# Altium footprint library USB Port.PcbLib: 17 footprints (part 1 of 2)
Each footprint in its own frame and in the unit in brackets; x right, y up, seen from the top. Pads: shape width x height; smd on the part's side, far side on the other; paste and mask are expansions set on the pad; w line width, h text height; cw(c..) or ccw(c..) is an arc to the next point about the centre after c.
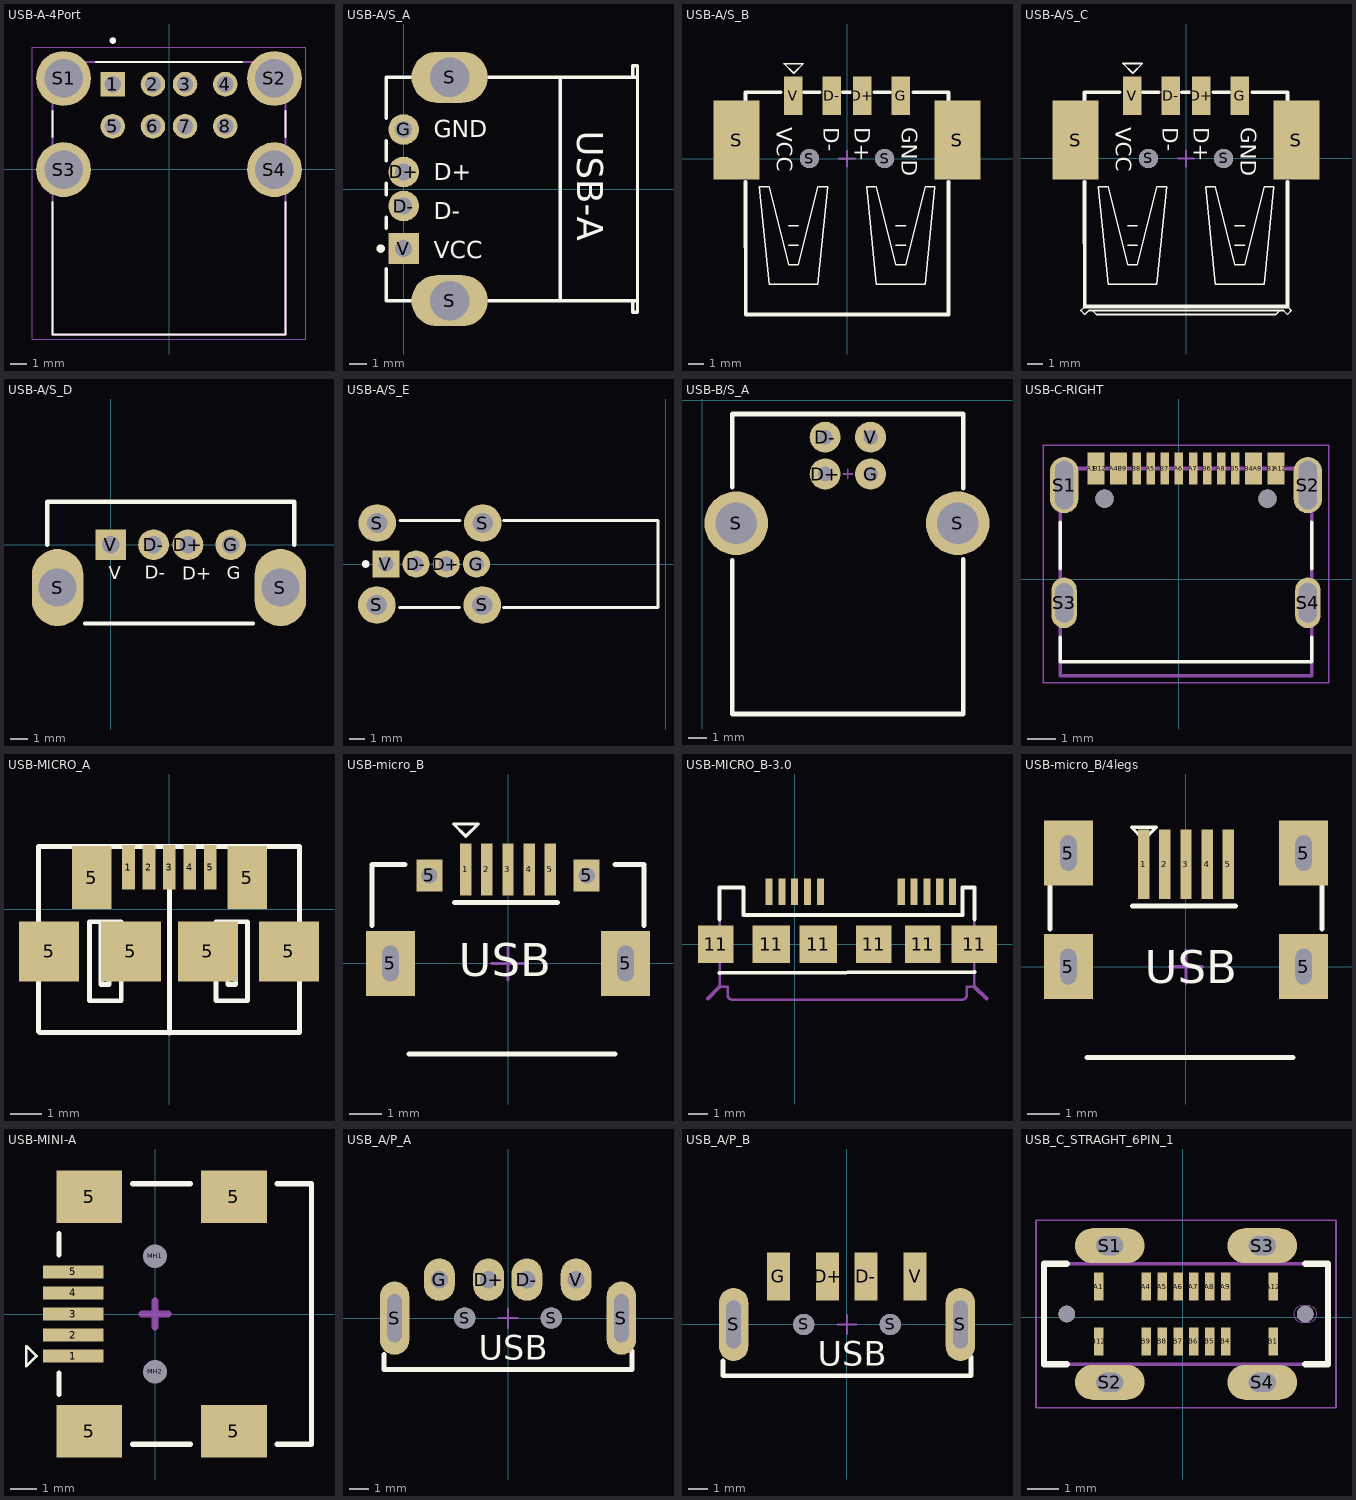
[diagram p0: the footprints below, top view; thin cyan lines are the x and y axes]

## USB-A-4Port [mm]
pads (12):
  rect 1.53x1.53 / inner round 1.53 / far side rect 1.53x1.53 hole 1.02: 1(-3.5,5.305)
  round 1.53 hole 1.02: 2(-1,5.305) 3(1,5.305) 4(3.5,5.305) 5(-3.5,2.685) 6(-1,2.685) 7(1,2.685) 8(3.5,2.685)
  round 3.416 hole 2.4: S1(-6.57,5.655) S2(6.57,5.655) S3(-6.57,-0.025) S4(6.57,-0.025)
Top Overlay:
  circle w0.2: c-3.5,8.015 r0.1
  lines w0.127: -7.25,-2.055 -7.25,-10.305 7.25,-10.305 7.25,-2.055 ; -7.25,2.005 -7.25,3.625 ; -4.54,6.675 4.54,6.675 ; 7.25,2.005 7.25,3.625
Mechanical 13:
  circle w0.2: c-3.5,8.015 r0.1
  lines w0.127: -7.25,-10.325 7.25,-10.325 7.25,6.675 -7.25,6.675 -7.25,-10.305 -7.25,-10.325
Mechanical 15:
  lines w0.05: -8.53,-10.575 -8.53,7.615 8.53,7.615 8.53,-10.575 -8.53,-10.575
3D body "step_temp.STEP": height 15.95, standoff -4.24, extent -7.9,-10.325 7.9,6.875

## USB-A/S_A [mm] "Aï¿½ï¿½Ö±ï¿½ï¿½Ä¸Í·ï¿½ï¿½"
height 7.01
pads (6):
  round 1.8 hole 1: D+(0,1) D-(0,-1) G(0,3.5)
  oval 4.5x3 hole 2.3: S(2.71,-6.57) S(2.71,6.57)
  rect 1.8x1.8 hole 1: V(0,-3.5)
Top Overlay:
  circle w0.25: c-1.35,-3.5 r0.125
  lines w0.2: -1.01,-4.7 -1.01,-6.565 0.41,-6.565 ; -1.01,-2.3 -1.01,-1.66 ; -1.01,-0.34 -1.01,0.34 ; -1.01,1.66 -1.01,2.84 ; -1.01,4.16 -1.01,6.565 0.41,6.565 ; 5.01,-6.565 13.752,-6.565 ; 5.01,6.565 13.752,6.565 ; 13.462,-6.565 13.462,-7.25 13.752,-7.25 13.752,7.25 13.462,7.25 13.462,6.565
  lines w0.203: 9.21,-6.565 9.21,6.565
  text "GND" at 1.778,3.048 h1.02
  text "D+" at 1.778,0.508 h1.02
  text "D-" at 1.778,-1.778 h1.02
  text "VCC" at 1.778,-4.064 h1.02
  text "USB-A" at 10.21,3.43 h1.52
3D body "USB A�� ĸ-1.STEP": height 6.8, standoff -4.31, extent -0.605,-7.342 13.7,7.342

## USB-A/S_B [mm] "Aï¿½ï¿½ï¿½ï¿½Æ¬Ä¸Í·ï¿½ï¿½"
pads (8):
  rect 1.2x2.5 smd: D+(1,4.1) D-(-1,4.1) G(3.5,4.1) V(-3.5,4.1)
  rect 3x5.15 smd: S(-7.2,1.2) S(7.2,1.2)
  round 1.25 hole 1.25 unplated: S(-2.45,0) S(2.45,0)
Top Overlay:
  lines w0.1: -3.803,-5.649 -3.168,-5.649 ; -3.803,-4.379 -3.168,-4.379 ; 3.182,-5.649 3.817,-5.649 ; 3.182,-4.379 3.817,-4.379 ; -5.708,-1.839 -5.073,-8.189 -1.898,-8.189 -1.263,-1.839 -1.898,-1.839 -3.168,-6.919 -3.803,-6.919 -5.073,-1.839 -5.708,-1.839 ; -4.113,6.19 -3.478,5.555 -2.843,6.19 -4.113,6.19 ; 1.277,-1.839 1.912,-8.189 5.087,-8.189 5.722,-1.839 5.087,-1.839 3.817,-6.919 3.182,-6.919 1.912,-1.839 1.277,-1.839
  lines w0.254: -6.604,-1.524 -6.597,-10.16 6.611,-10.16 6.604,-1.524 ; -6.604,3.81 -6.604,4.318 -4.318,4.318 ; -2.794,4.318 -1.778,4.318 ; -0.254,4.318 0.254,4.318 ; 1.778,4.318 2.794,4.318 ; 4.318,4.318 6.611,4.318 6.604,3.81
  text "GND" at 3.556,2.032 h1.02
  text "D+" at 0.508,2.032 h1.02
  text "D-" at -1.524,2.032 h1.02
  text "VCC" at -4.572,2.032 h1.02
Mechanical 15:
  lines w0.127: -0.508,0 0.508,0 ; 0,-0.508 0,0.508
3D body "USB A�� ��Ƭ-ĸ-1.STEP": height 6.9, standoff -0.55, extent -7.75,-9.9 7.75,4.8

## USB-A/S_C [mm] "Aï¿½ï¿½ï¿½ï¿½Æ¬Ä¸Í·ï¿½ï¿½"
pads (8):
  rect 1.2x2.5 smd: D+(1,4.1) D-(-1,4.1) G(3.5,4.1) V(-3.5,4.1)
  rect 3x5.15 smd: S(-7.2,1.2) S(7.2,1.2)
  round 1.25 hole 1.25 unplated: S(-2.45,0) S(2.45,0)
Top Overlay:
  lines w0.1: -6.597,-9.652 -6.851,-9.906 -6.597,-10.16 -6.343,-9.906 -6.089,-9.906 ; -3.803,-5.649 -3.168,-5.649 ; -3.803,-4.379 -3.168,-4.379 ; 3.182,-5.649 3.817,-5.649 ; 3.182,-4.379 3.817,-4.379 ; 6.611,-9.652 6.865,-9.906 6.611,-10.16 6.357,-9.906 6.103,-9.906 ; -6.089,-9.906 -5.835,-10.166 5.849,-10.166 6.103,-9.906 ; -6.089,-9.906 6.103,-9.906 ; -5.708,-1.839 -5.073,-8.189 -1.898,-8.189 -1.263,-1.839 -1.898,-1.839 -3.168,-6.919 -3.803,-6.919 -5.073,-1.839 -5.708,-1.839 ; -4.113,6.19 -3.478,5.555 -2.843,6.19 -4.113,6.19 ; 1.277,-1.839 1.912,-8.189 5.087,-8.189 5.722,-1.839 5.087,-1.839 3.817,-6.919 3.182,-6.919 1.912,-1.839 1.277,-1.839
  lines w0.254: -6.604,-1.524 -6.597,-9.652 ; -6.604,3.81 -6.604,4.318 -4.318,4.318 ; -6.597,-9.652 6.611,-9.652 ; -2.794,4.318 -1.778,4.318 ; -0.254,4.318 0.254,4.318 ; 1.778,4.318 2.794,4.318 ; 4.318,4.318 6.611,4.318 6.604,3.81 ; 6.604,-1.524 6.611,-9.652
  text "GND" at 3.556,2.032 h1.02
  text "D+" at 0.508,2.032 h1.02
  text "D-" at -1.524,2.032 h1.02
  text "VCC" at -4.572,2.032 h1.02
Mechanical 15:
  lines w0.127: -0.508,0 0.508,0 ; 0,-0.508 0,0.508
3D body "USB A�� ��Ƭ-ĸ-2.STEP": height 7.4, standoff -0.55, extent -7.75,-9.9 7.75,4.8

## USB-A/S_D [mm] "Aï¿½ï¿½Ö±ï¿½ï¿½Ä¸Í·ï¿½ï¿½"
pads (6):
  round 1.8 hole 1: D+(4.5,0) D-(2.5,0) G(7,0)
  oval 3x4.5 hole 2.2: S(-3.1,-2.5) S(9.9,-2.5)
  rect 1.8x1.8 hole 1: V(0,0)
Top Overlay:
  lines w0.254: -3.7,0 -3.7,2.5 10.7,2.5 10.7,0 ; -1.5,-4.6 8.3,-4.6
  text "V" at -0.112,-2.007 h0.76
  text "G" at 6.771,-2.007 h0.76
  text "D+" at 4.181,-2.032 h0.76
  text "D-" at 1.996,-1.981 h0.76
Mechanical 1:
  lines w0.254: -0.2,-0.2 cw(c0,-0.2) 0,0
3D body "USB-H.stp": height 14, standoff -4, extent -3.705,-4.599 10.695,2.501

## USB-A/S_E [mm] "Aï¿½ï¿½Ö±ï¿½ï¿½Ä¸Í·ï¿½ï¿½"
pads (8):
  round 1.8 hole 1: D+(-14.56,0) D-(-16.56,0) G(-12.56,0)
  round 2.5 hole 1.35: S(-19.167,-2.718) S(-19.141,2.718) S(-12.167,-2.718) S(-12.141,2.718)
  rect 1.8x1.8 hole 1: V(-18.56,0)
Top Overlay:
  circle w0.25: c-19.91,0 r0.125
  lines w0.2: -17.65,-2.878 -13.684,-2.878 ; -17.624,2.878 -13.658,2.878 ; -10.773,-2.88 -0.508,-2.88 -0.508,2.88 -10.773,2.88
3D body "USB-4H4.stp": height 14.45, standoff -3.69, extent -19.725,-3.606 -0.475,3.644

## USB-B/S_A [mm] "bï¿½ï¿½USB Ä¸ï¿½ï¿½ 16.3*13.7*11mm"
height 1.1
pads (6):
  round 1.7 hole 0.8: D+(6.751,-4.064) D-(6.751,-2.032) G(9.251,-4.064) V(9.251,-2.032)
  round 3.5 hole 2.3: S(1.86,-6.774) S(14.052,-6.774)
Top Overlay:
  lines w0.254: 1.651,-8.801 1.651,-17.272 14.351,-17.272 14.351,-8.75 ; 1.651,-4.788 1.651,-0.762 14.351,-0.762 14.351,-4.839
Mechanical 15:
  lines w0.1: 7.747,-4.064 8.255,-4.064 ; 8.001,-4.318 8.001,-3.81
3D body "USB B�� ĸ-1.STEP": height 11.45, standoff -2.95, extent 1.141,-17.224 14.86,-0.924

## USB-C-RIGHT [mm]
pads (22):
  rect 0.3x1.14 smd: A1(-3.096,3.937) A4(-2.296,3.937) A5(-0.996,3.937) A6(0.004,3.937) A7(0.504,3.937) A8(1.504,3.937) A9(2.804,3.937) A12(3.604,3.937) B1(3.304,3.937) B4(2.504,3.937) B5(2.004,3.937) B6(1.004,3.937) B7(-0.496,3.937) B8(-1.496,3.937) B9(-1.996,3.937) B12(-2.796,3.937)
  oval 1x2 hole 0.65 slot 1.72 at 90 deg: S1(-4.071,3.347) S2(4.579,3.347)
  oval 0.9x1.8 hole 0.65 slot 1.4 at 90 deg: S3(-4.071,-0.833) S4(4.579,-0.833)
  round 0.65 hole 0.65 unplated: ""(-2.636,2.867) ""(3.144,2.867)
Top Overlay:
  lines w0.127: -4.216,-2.063 -4.216,-2.923 4.724,-2.923 4.724,-2.063 ; -4.216,0.387 -4.216,2.027 ; 4.724,0.387 4.724,2.027
Mechanical 1:
  lines w0: 4.254,3.844 cw(c4.589,3.862) 4.571,4.197 cw(c4.589,3.882) 4.904,3.899 ; 4.254,3.847 4.254,2.797 ccw(c4.564,2.807) 4.575,2.497 ; 4.572,2.497 ccw(c4.589,2.812) 4.904,2.795 ; 4.904,2.797 4.904,3.897
Mechanical 13:
  lines w0.127: -4.216,-3.413 4.724,-3.413 4.724,3.937 -4.216,3.937 -4.216,-3.413
Mechanical 15:
  lines w0.05: -4.821,-3.663 5.329,-3.663 5.329,4.757 -4.821,4.757 -4.821,-3.663
3D body "step_temp.STEP": height 3.26, standoff -1, extent -4.216,-3.359 4.724,4.391

## USB-MICRO_A [mm] "microï¿½ï¿½USB ï¿½ï¿½5.9*8.2*2.5mm"
pads (11):
  rect 0.4x1.4 smd: 1(-1.283,1.333) 2(-0.635,1.333) 3(0.013,1.333) 4(0.66,1.333) 5(1.308,1.333)
  rect 1.9x1.9 smd: 5(-3.797,-1.333) 5(-1.206,-1.333) 5(1.232,-1.333) 5(3.797,-1.333)
  rect 1.25x2 smd: 5(-2.451,1.003) 5(2.476,1.003)
Top Overlay:
  lines w0.152: -4.127,-3.873 -4.127,1.994 ; -4.102,-3.899 4.102,-3.899 ; -4.077,1.994 4.102,1.994 ; -2.152,-0.394 -2.152,-2.379 -1.949,-2.379 -1.898,-2.379 -1.898,-0.394 ; 0.013,-3.91 0.013,1.968 ; 1.861,-0.394 1.861,-2.379 2.115,-2.379 2.115,-0.394 ; 4.127,-3.899 4.127,1.994 ; -2.513,-2.894 -1.513,-2.894 -1.513,-0.394 -2.513,-0.394 -2.513,-2.894 ; 1.487,-2.894 1.487,-0.394 2.487,-0.394 2.487,-2.894 1.487,-2.894
3D body "MICRO USB.STEP": height 2.77, standoff -0.17, extent -4.1,-3.912 4.1,2.018

## USB-micro_B [mm] "microï¿½ï¿½USB ï¿½ï¿½5.7*7.8*2.5mm"
pads (9):
  rect 0.35x1.6 smd: 1(-1.3,2.9) 2(-0.65,2.9) 3(0,2.9) 4(0.65,2.9) 5(1.3,2.9)
  rect 1.5x2 hole 0.5 slot 1.1 at 90 deg: 5(-3.625,0) 5(3.625,0)
  rect 0.8x1 hole 0.5: 5(-2.425,2.71) 5(2.425,2.71)
Top Overlay:
  lines w0.1: -1.681,4.297 -0.919,4.297 -1.3,3.916 -1.681,4.297
  lines w0.152: -4.191,1.168 -4.191,3.048 -3.175,3.048 ; -3.048,-2.794 3.302,-2.794 ; -1.65,1.875 1.525,1.875 ; 3.302,3.048 4.191,3.048 4.191,1.168
  text "USB" at -1.524,-0.402 h1.02
Mechanical 15:
  lines w0.1: -0.508,0 0.508,0 ; 0,-0.508 0,0.508
3D body "USB micro_A.STEP": height 2.8, standoff -0.95, extent -4.001,-2.71 4.001,2.89

## USB-MICRO_B-3.0 [mm]
pads (16):
  rect 0.36x1.35 smd: 1(-1.3,2.667) 2(-0.65,2.667) 3(0,2.667) 4(0.65,2.667) 5(1.3,2.667) 6(5.4,2.667) 7(6.05,2.667) 8(6.7,2.667) 9(7.35,2.667) 10(8,2.667)
  rect 1.8x1.9 smd: 11(-4,0) 11(4,0) 11(6.5,0)
  rect 1.9x1.9 smd: 11(-1.2,0) 11(1.2,0)
  rect 2.3x1.9 smd: 11(9.1,0)
Top Overlay:
  lines w0.203: -3.8,-1.45 9.1,-1.4 ; -3.8,1.27 -3.8,2.87 -2.6,2.87 -2.6,1.473 8.5,1.473 8.5,2.87 9.104,2.87 9.104,1.27
Mechanical 16:
  lines w0.127: 1.81,1.473 -2.6,1.473 -2.6,2.87 -3.8,2.87 -3.8,-1.45 ; 3.004,-1.45 -3.8,-1.45 ; 8.469,-2.8 ccw(c8.486,-2.56) 8.723,-2.6 8.723,-2.15 9.104,-2.15 9.104,-1.45 9.104,2.87 8.5,2.87 8.5,1.473 ; 8.5,-2.8 -3.2,-2.8 cw(c-3.162,-2.565) -3.4,-2.55 -3.4,-2.15 -3.8,-2.15 -3.8,-1.45
  lines w0.203: -4.4,-2.75 -3.8,-2.15 ; 9.104,-2.15 9.713,-2.75
3D body "uj3-miabh-1-smt.stp": height 2.75, standoff -0.27, extent -4.425,-2.809 9.725,2.9

## USB-micro_B/4legs [mm] "microï¿½ï¿½USB ï¿½ï¿½5.7*7.8*2.5mm"
pads (9):
  rect 0.35x2.15 smd: 1(-1.3,3.154) 2(-0.65,3.154) 3(0,3.154) 4(0.65,3.154) 5(1.3,3.154)
  rect 1.5x2 hole 0.5 slot 1.1 at 90 deg: 5(-3.625,0) 5(-3.625,3.5) 5(3.625,0) 5(3.625,3.5)
Top Overlay:
  lines w0.1: -1.681,4.297 -1.3,3.916 -0.919,4.297 -1.681,4.297
  lines w0.152: -4.191,1.168 -4.191,3.048 -3.175,3.048 ; -3.048,-2.794 3.302,-2.794 ; -1.65,1.875 1.525,1.875 ; 3.302,3.048 4.191,3.048 4.191,1.168
  text "USB" at -1.27,-0.508 h1.02
Mechanical 15:
  lines w0.1: -0.508,0 0.508,0 ; 0,-0.508 0,0.508
3D body "micre USB.stp": height 2.7, standoff -0.67, extent -4,-2.718 4,3.882

## USB-MINI-A [mm] "MINIï¿½ï¿½USBï¿½ï¿½7.9*7.5*4.1mm"
pads (11):
  rect 2.3x0.5 smd: 1(-3.108,-1.6) 2(-3.108,-0.8) 3(-3.108,0) 4(-3.108,0.8) 5(-3.108,1.6)
  rect 2.5x2 smd: 5(-2.5,-4.45) 5(-2.5,4.45) 5(3,-4.45) 5(3,4.45)
  round 0.6 hole 0.9 unplated: MH1(0,2.2) MH2(0,-2.2)
Top Overlay:
  lines w0.1: -4.886,-1.981 -4.886,-1.219 -4.505,-1.6 -4.886,-1.981
  lines w0.2: -3.65,-3.05 -3.65,-2.25 ; -3.65,2.25 -3.65,3.05 ; -0.85,-4.95 1.35,-4.95 ; -0.85,4.95 1.35,4.95 ; 4.65,-4.95 5.95,-4.95 5.95,4.95 4.65,4.95
Mechanical 15:
  lines w0.254: -0.508,0 0.508,0 ; 0,-0.508 0,0.508
3D body "USB MINI B�� ��Ƭ-ĸ-1.STEP": height 3.95, standoff -0.7, extent -3.7,-4.75 6,4.75

## USB_A/P_A [mm] "Aï¿½ï¿½USB ï¿½ï¿½Í·ï¿½ï¿½20*13*4.5mm"
height 1.75
pads (8):
  oval 1.6x2.2 hole 0.9: D+(-1.013,2) D-(0.987,2) G(-3.569,2) V(3.543,2)
  oval 1.524x3.81 hole 0.762 slot 2.5 at 90 deg: S(-5.9,0) S(5.9,0)
  round 1.1 hole 1.1: S(-2.25,0) S(2.25,0)
Top Overlay:
  lines w0.254: -6.45,-1.9 -6.45,-2.667 6.45,-2.667 6.45,-1.7
  text "USB" at -1.524,-2.159 h1.27
Mechanical 15:
  lines w0.1: -0.508,0 0.508,0 ; 0,-0.508 0,0.508
3D body "USB A�� ��-2.STEP": height 3.25, standoff -2.52, extent -6.473,-17.9 6.473,2.105

## USB_A/P_B [mm] "Aï¿½ï¿½USB ï¿½ï¿½Í·ï¿½ï¿½20*13*4.5mm"
height 1.75
pads (8):
  rect 1.2x2.5 smd: D+(-1,2.508) D-(1,2.508) G(-3.556,2.508) V(3.556,2.508)
  oval 1.524x3.81 hole 0.762 slot 2.5 at 90 deg: S(-5.887,0) S(5.913,0)
  round 1.1 hole 1.1: S(-2.237,0) S(2.263,0)
Top Overlay:
  lines w0.254: -6.437,-1.9 -6.437,-2.667 6.463,-2.667 6.463,-1.7
  text "USB" at -1.511,-2.159 h1.27
Mechanical 15:
  lines w0.1: -0.495,0 0.521,0 ; 0.013,-0.508 0.013,0.508
3D body "USB A�� ��-1.STEP": height 3.25, standoff -2.52, extent -6.46,-17.9 6.487,2.7

## USB_C_STRAGHT_6PIN_1 [mm]
pads (22):
  rect 0.3x0.87 smd: A1(-2.648,0.967) A4(-1.148,0.967) A5(-0.648,0.967) A6(-0.148,0.967) A7(0.352,0.967) A8(0.852,0.967) A9(1.352,0.967) A12(2.852,0.967) B1(2.852,-0.763) B4(1.352,-0.763) B5(0.852,-0.763) B6(0.352,-0.763) B7(-0.148,-0.763) B8(-0.648,-0.763) B9(-1.148,-0.763) B12(-2.648,-0.763)
  oval 2.2x1.1 hole 0.6 slot 0.85 at 0 deg: S1(-2.298,2.252) S2(-2.298,-2.048) S3(2.502,2.252) S4(2.502,-2.048)
  round 0.52 hole 0.52 unplated: ""(-3.648,0.102) ""(3.852,0.102)
Top Overlay:
  lines w0.2: -3.648,-1.478 -4.368,-1.478 -4.368,1.682 -3.648,1.682 ; 3.852,-1.478 4.572,-1.478 4.572,1.682 3.852,1.682
Mechanical 1:
  lines w0: 3.492,0.102 cw(c3.752,0.102) 3.752,0.362 3.952,0.362 cw(c3.952,0.102) 4.212,0.102 cw(c3.952,0.102) 3.952,-0.158 3.752,-0.158 cw(c3.752,0.102) 3.492,0.102
Mechanical 13:
  lines w0.1: -4.368,-1.478 -4.368,1.682 4.572,1.682 4.572,-1.478 -4.368,-1.478
Mechanical 15:
  lines w0.05: -4.618,-2.848 -4.618,3.052 4.822,3.052 4.822,-2.848 -4.618,-2.848
3D body "USB4120-03-C--3DModel-STEP-56544.STEP": height 6.5, standoff -0.95, extent -4.368,-2.198 4.572,2.402